# Altium integrated library Altium_PCB_Connector.IntLib: 293 symbols (part 2 of 3) (continued)
## 653115131822 (continued)
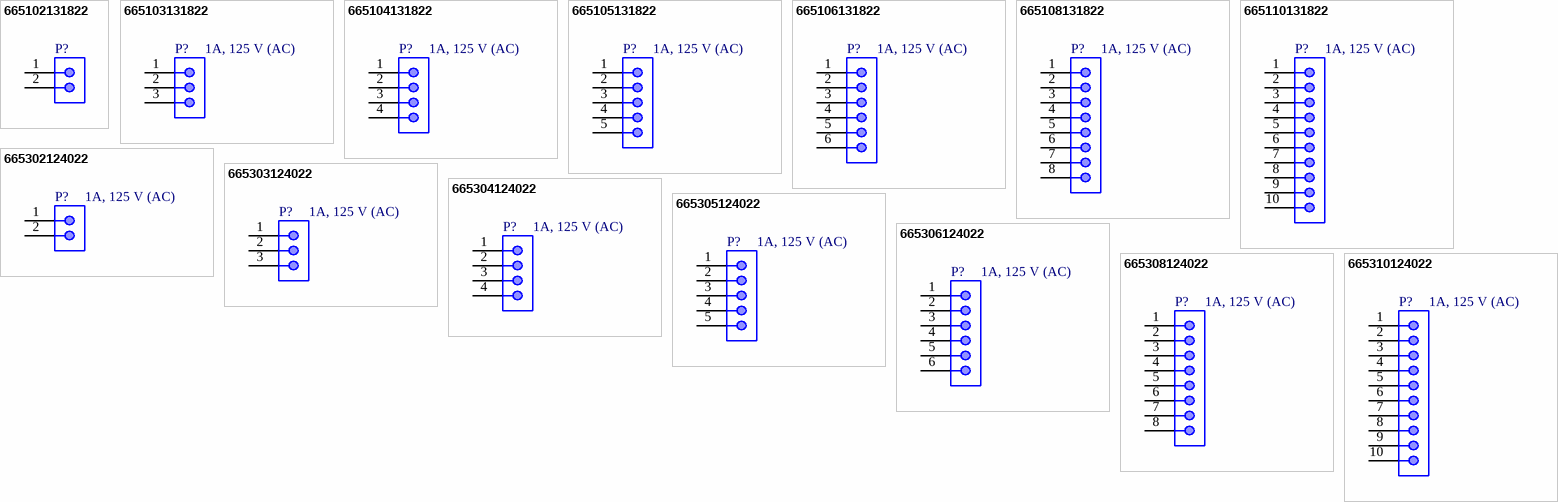
[diagram p9: symbols 665102131822 to 665310124022]

## 665102131822
designator P?, comment 1A, 125 V (AC)  (value not drawn)
WR-WTB SMT Male Horizontal Shrouded Header, pitch 1mm, 2p; Manufacturer: Wurth Elektronik; Manufacturer Part Number: 665102131822; Contact Resistance: 20mOhm; Withstanding Voltage: 500VAC; Working Voltage: 50VAC; Pin Number: 2; ComponentLink1Description: Datasheet; ComponentLink1URL: https://www.we-online.com/catalog/datasheet/665102131822.pdf; Pitch: 1mm; Packaging: Tape and Reel; Gender: Male; Type: Horizontal; Rated Current: 1A; Supplier 1 URL: https://www.mouser.vn/ProductDetail/Wurth-Elektronik/665102131822?qs=a9WhcLg8qCyfz%252BqUVI6DEA%3D%3D; Supplier 2 URL: N/A; Supplier 3 URL: N/A; Value: 1A, 125 V (AC); LCSC Part #: N/A; Mount: SMD/SMT; Operating Temperature Max: + 85 C; Operating Temperature Min: - 25 C; Package / Case: 2; Supplier 1: Mouser; Supplier 1 Part Number: 710-665102131822; Supplier 2: Digi-Key; Supplier 2 Part Number: N/A; Supplier 3: thegioiic; Supplier 3 Part Number: N/A
footprint 665102131822
pins: 1, 2

## 665103131822
designator P?, comment 1A, 125 V (AC)
WR-WTB SMT Male Horizontal Shrouded Header, pitch 1mm, 3p; Manufacturer: Wurth Elektronik; Manufacturer Part Number: 665103131822; Pin Number: 3; Contact Resistance: 20mOhm; Withstanding Voltage: 500VAC; Working Voltage: 50VAC; ComponentLink1Description: Datasheet; ComponentLink1URL: https://www.we-online.com/catalog/datasheet/665103131822.pdf; Pitch: 1mm; Packaging: Tape and Reel; Gender: Male; Type: Horizontal; Rated Current: 1A; Supplier 1 URL: https://www.mouser.vn/ProductDetail/Wurth-Elektronik/665103131822?qs=a9WhcLg8qCxyoubUoVempg%3D%3D; Supplier 2 URL: N/A; Supplier 3 URL: N/A; Value: 1A, 125 V (AC); LCSC Part #: N/A; Mount: SMD/SMT; Operating Temperature Max: + 85 C; Operating Temperature Min: - 25 C; Package / Case: 3; Supplier 1: Mouser; Supplier 1 Part Number: 710-665103131822; Supplier 2: Digi-Key; Supplier 2 Part Number: N/A; Supplier 3: thegioiic; Supplier 3 Part Number: N/A
footprint 665103131822
pins: 1, 2, 3

## 665104131822
designator P?, comment 1A, 125 V (AC)
WR-WTB SMT Male Horizontal Shrouded Header, pitch 1mm, 4p; Manufacturer: Wurth Elektronik; Manufacturer Part Number: 665104131822; Pin Number: 4; Contact Resistance: 20mOhm; Withstanding Voltage: 500VAC; Working Voltage: 50VAC; ComponentLink1Description: Datasheet; ComponentLink1URL: https://www.we-online.com/catalog/datasheet/665104131822.pdf; Pitch: 1mm; Packaging: Tape and Reel; Gender: Male; Type: Horizontal; Rated Current: 1A; Supplier 1 URL: https://www.mouser.vn/ProductDetail/Wurth-Elektronik/665104131822?qs=a9WhcLg8qCxe2o4Xu%2FqBdg%3D%3D; Supplier 2 URL: N/A; Supplier 3 URL: N/A; Value: 1A, 125 V (AC); LCSC Part #: N/A; Mount: SMD/SMT; Operating Temperature Max: + 85 C; Operating Temperature Min: - 25 C; Package / Case: 4; Supplier 1: Mouser; Supplier 1 Part Number: 710-665104131822; Supplier 2: Digi-Key; Supplier 2 Part Number: N/A; Supplier 3: thegioiic; Supplier 3 Part Number: N/A
footprint 665104131822
pins: 1, 2, 3, 4

## 665105131822
designator P?, comment 1A, 125 V (AC)
WR-WTB SMT Male Horizontal Shrouded Header, pitch 1mm, 5p; Manufacturer: Wurth Elektronik; Manufacturer Part Number: 665105131822; Pin Number: 5; Contact Resistance: 20mOhm; Withstanding Voltage: 500VAC; Working Voltage: 50VAC; ComponentLink1Description: Datasheet; ComponentLink1URL: https://www.we-online.com/catalog/datasheet/665105131822.pdf; Pitch: 1mm; Packaging: Tape and Reel; Gender: Male; Type: Horizontal; Rated Current: 1A; Supplier 1 URL: https://www.mouser.vn/ProductDetail/Wurth-Elektronik/665105131822?qs=a9WhcLg8qCxS6l8cra2J9Q%3D%3D; Supplier 2 URL: N/A; Supplier 3 URL: N/A; Value: 1A, 125 V (AC); LCSC Part #: N/A; Mount: SMD/SMT; Operating Temperature Max: + 85 C; Operating Temperature Min: - 25 C; Package / Case: 5; Supplier 1: Mouser; Supplier 1 Part Number: 710-665105131822; Supplier 2: Digi-Key; Supplier 2 Part Number: N/A; Supplier 3: thegioiic; Supplier 3 Part Number: N/A
footprint 665105131822
pins: 1, 2, 3, 4, 5

## 665106131822
designator P?, comment 1A, 125 V (AC)
WR-WTB SMT Male Horizontal Shrouded Header, pitch 1mm, 6p; Manufacturer: Wurth Elektronik; Manufacturer Part Number: 665106131822; Pin Number: 6; Contact Resistance: 20mOhm; Withstanding Voltage: 500VAC; Working Voltage: 50VAC; ComponentLink1Description: Datasheet; ComponentLink1URL: https://www.we-online.com/catalog/datasheet/665106131822.pdf; Pitch: 1mm; Packaging: Tape and Reel; Gender: Male; Type: Horizontal; Rated Current: 1A; Supplier 1 URL: https://www.mouser.vn/ProductDetail/Wurth-Elektronik/665106131822?qs=a9WhcLg8qCzjoKPkPpCp%2FA%3D%3D; Supplier 2 URL: N/A; Supplier 3 URL: N/A; Value: 1A, 125 V (AC); LCSC Part #: N/A; Mount: SMD/SMT; Operating Temperature Max: + 85 C; Operating Temperature Min: - 25 C; Package / Case: 6; Supplier 1: Mouser; Supplier 1 Part Number: 710-665106131822; Supplier 2: Digi-Key; Supplier 2 Part Number: N/A; Supplier 3: thegioiic; Supplier 3 Part Number: N/A
footprint 665106131822
pins: 1, 2, 3, 4, 5, 6

## 665108131822
designator P?, comment 1A, 125 V (AC)
WR-WTB SMT Male Horizontal Shrouded Header, pitch 1mm, 8p; Manufacturer: Wurth Elektronik; Manufacturer Part Number: 665108131822; Pin Number: 8; Contact Resistance: 20mOhm; Withstanding Voltage: 500VAC; Working Voltage: 50VAC; ComponentLink1Description: Datasheet; ComponentLink1URL: https://www.we-online.com/catalog/datasheet/665108131822.pdf; Pitch: 1mm; Packaging: Tape and Reel; Gender: Male; Type: Horizontal; Rated Current: 1A; Supplier 1 URL: https://www.mouser.vn/ProductDetail/Wurth-Elektronik/665108131822?qs=a9WhcLg8qCyjJKQ1fQ4DGg%3D%3D; Supplier 2 URL: N/A; Supplier 3 URL: N/A; Value: 1A, 125 V (AC); LCSC Part #: N/A; Mount: SMD/SMT; Operating Temperature Max: + 85 C; Operating Temperature Min: - 25 C; Package / Case: 8; Supplier 1: Mouser; Supplier 1 Part Number: 710-665108131822; Supplier 2: Digi-Key; Supplier 2 Part Number: N/A; Supplier 3: thegioiic; Supplier 3 Part Number: N/A
footprint 665108131822
pins: 1, 2, 3, 4, 5, 6, 7, 8

## 665110131822
designator P?, comment 1A, 125 V (AC)
WR-WTB SMT Male Horizontal Shrouded Header, pitch 1mm, 10p; Manufacturer: Wurth Elektronik; Manufacturer Part Number: 665110131822; Pin Number: 10; Contact Resistance: 20mOhm; Withstanding Voltage: 500VAC; Working Voltage: 50VAC; ComponentLink1Description: Datasheet; ComponentLink1URL: https://www.we-online.com/catalog/datasheet/665110131822.pdf; Pitch: 1mm; Packaging: Tape and Reel; Gender: Male; Type: Horizontal; Rated Current: 1A; Supplier 1 URL: https://www.mouser.vn/ProductDetail/Wurth-Elektronik/665110131822?qs=a9WhcLg8qCwEjDOe0bibPQ%3D%3D; Supplier 2 URL: N/A; Supplier 3 URL: N/A; Value: 1A, 125 V (AC); LCSC Part #: N/A; Mount: SMD/SMT; Operating Temperature Max: + 85 C; Operating Temperature Min: - 25 C; Package / Case: 10; Supplier 1: Mouser; Supplier 1 Part Number: 710-665110131822; Supplier 2: Digi-Key; Supplier 2 Part Number: N/A; Supplier 3: thegioiic; Supplier 3 Part Number: N/A
footprint 665110131822
pins: 1, 2, 3, 4, 5, 6, 7, 8, 9, 10

## 665302124022
designator P?, comment 1A, 125 V (AC)
WR-WTB SMT Male Vertical Shrouded Header, pitch 1mm, 2p; Manufacturer: Wurth Elektronik; Manufacturer Part Number: 665302124022; Pin Number: 2; Contact Resistance: 20mOhm; Withstanding Voltage: 500VAC; Working Voltage: 50VAC; ComponentLink1Description: Datasheet; ComponentLink1URL: https://www.we-online.com/catalog/datasheet/665302124022.pdf; Pitch: 1mm; Packaging: Tape and Reel; Gender: Male; Type: Vertical; Rated Current: 1A; Supplier 1 URL: https://www.mouser.vn/ProductDetail/Wurth-Elektronik/665302124022?qs=a9WhcLg8qCx0IT99cXBqTA%3D%3D; Supplier 2 URL: N/A; Supplier 3 URL: N/A; Value: 1A, 125 V (AC); LCSC Part #: N/A; Mount: SMD/SMT; Operating Temperature Max: + 85 C; Operating Temperature Min: - 25 C; Package / Case: 2; Supplier 1: Mouser; Supplier 1 Part Number: 710-665302124022; Supplier 2: Digi-Key; Supplier 2 Part Number: N/A; Supplier 3: thegioiic; Supplier 3 Part Number: N/A
footprint 665302124022
pins: 1, 2

## 665303124022
designator P?, comment 1A, 125 V (AC)
WR-WTB SMT Male Vertical Shrouded Header, pitch 1mm, 3p; Manufacturer: Wurth Elektronik; Manufacturer Part Number: 665303124022; Pin Number: 3; Contact Resistance: 20mOhm; Withstanding Voltage: 500VAC; Working Voltage: 50VAC; ComponentLink1Description: Datasheet; ComponentLink1URL: https://www.we-online.com/catalog/datasheet/665303124022.pdf; Pitch: 1mm; Packaging: Tape and Reel; Gender: Male; Type: Vertical; Rated Current: 1A; Supplier 1 URL: https://www.mouser.vn/ProductDetail/Wurth-Elektronik/665303124022?qs=a9WhcLg8qCyV5ri9HU4hCQ%3D%3D; Supplier 2 URL: N/A; Supplier 3 URL: N/A; Value: 1A, 125 V (AC); LCSC Part #: N/A; Mount: SMD/SMT; Operating Temperature Max: + 85 C; Operating Temperature Min: - 25 C; Package / Case: 3; Supplier 1: Mouser; Supplier 1 Part Number: 710-665303124022; Supplier 2: Digi-Key; Supplier 2 Part Number: N/A; Supplier 3: thegioiic; Supplier 3 Part Number: N/A
footprint 665303124022
pins: 1, 2, 3

## 665304124022
designator P?, comment 1A, 125 V (AC)
WR-WTB SMT Male Vertical Shrouded Header, pitch 1mm, 4p; Manufacturer: Wurth Elektronik; Manufacturer Part Number: 665304124022; Pin Number: 4; Contact Resistance: 20mOhm; Withstanding Voltage: 500VAC; Working Voltage: 50VAC; ComponentLink1Description: Datasheet; ComponentLink1URL: https://www.we-online.com/catalog/datasheet/665304124022.pdf; Pitch: 1mm; Packaging: Tape and Reel; Gender: Male; Type: Vertical; Rated Current: 1A; Supplier 1 URL: https://www.mouser.vn/ProductDetail/Wurth-Elektronik/665304124022?qs=a9WhcLg8qCx8aEna1KcTfg%3D%3D; Supplier 2 URL: N/A; Supplier 3 URL: N/A; Value: 1A, 125 V (AC); LCSC Part #: N/A; Mount: SMD/SMT; Operating Temperature Max: + 85 C; Operating Temperature Min: - 25 C; Package / Case: 4; Supplier 1: Mouser; Supplier 1 Part Number: 710-665304124022; Supplier 2: Digi-Key; Supplier 2 Part Number: N/A; Supplier 3: thegioiic; Supplier 3 Part Number: N/A
footprint 665304124022
pins: 1, 2, 3, 4

## 665305124022
designator P?, comment 1A, 125 V (AC)
WR-WTB SMT Male Vertical Shrouded Header, pitch 1mm, 5p; Manufacturer: Wurth Elektronik; Manufacturer Part Number: 665305124022; Pin Number: 5; Contact Resistance: 20mOhm; Withstanding Voltage: 500VAC; Working Voltage: 50VAC; ComponentLink1Description: Datasheet; ComponentLink1URL: https://www.we-online.com/catalog/datasheet/665305124022.pdf; Pitch: 1mm; Packaging: Tape and Reel; Gender: Male; Type: Vertical; Rated Current: 1A; Supplier 1 URL: https://www.mouser.vn/ProductDetail/Wurth-Elektronik/665305124022?qs=a9WhcLg8qCwo9s3v61a5IA%3D%3D; Supplier 2 URL: N/A; Supplier 3 URL: N/A; Value: 1A, 125 V (AC); LCSC Part #: N/A; Mount: SMD/SMT; Operating Temperature Max: + 85 C; Operating Temperature Min: - 25 C; Package / Case: 5; Supplier 1: Mouser; Supplier 1 Part Number: 710-665305124022; Supplier 2: Digi-Key; Supplier 2 Part Number: N/A; Supplier 3: thegioiic; Supplier 3 Part Number: N/A
footprint 665305124022
pins: 1, 2, 3, 4, 5

## 665306124022
designator P?, comment 1A, 125 V (AC)
WR-WTB SMT Male Vertical Shrouded Header, pitch 1mm, 6p; Manufacturer: Wurth Elektronik; Manufacturer Part Number: 665306124022; Pin Number: 6; Contact Resistance: 20mOhm; Withstanding Voltage: 500VAC; Working Voltage: 50VAC; ComponentLink1Description: Datasheet; ComponentLink1URL: https://www.we-online.com/catalog/datasheet/665306124022.pdf; Pitch: 1mm; Packaging: Tape and Reel; Gender: Male; Type: Vertical; Rated Current: 1A; Supplier 1 URL: https://www.mouser.vn/ProductDetail/Wurth-Elektronik/665306124022?qs=a9WhcLg8qCxSEVNGK%2FCChQ%3D%3D; Supplier 2 URL: N/A; Supplier 3 URL: N/A; Value: 1A, 125 V (AC); LCSC Part #: N/A; Mount: SMD/SMT; Operating Temperature Max: + 85 C; Operating Temperature Min: - 25 C; Package / Case: 6; Supplier 1: Mouser; Supplier 1 Part Number: 710-665306124022; Supplier 2: Digi-Key; Supplier 2 Part Number: N/A; Supplier 3: thegioiic; Supplier 3 Part Number: N/A
footprint 665306124022
pins: 1, 2, 3, 4, 5, 6

## 665308124022
designator P?, comment 1A, 125 V (AC)
WR-WTB SMT Male Vertical Shrouded Header, pitch 1mm, 8p; Manufacturer: Wurth Elektronik; Manufacturer Part Number: 665308124022; Pin Number: 8; Contact Resistance: 20mOhm; Withstanding Voltage: 500VAC; Working Voltage: 50VAC; ComponentLink1Description: Datasheet; ComponentLink1URL: https://www.we-online.com/catalog/datasheet/665308124022.pdf; Pitch: 1mm; Packaging: Tape and Reel; Gender: Male; Type: Vertical; Rated Current: 1A; Supplier 1 URL: https://www.mouser.vn/ProductDetail/Wurth-Elektronik/665308124022?qs=a9WhcLg8qCyktw513mQiKg%3D%3D; Supplier 2 URL: N/A; Supplier 3 URL: N/A; Value: 1A, 125 V (AC); LCSC Part #: N/A; Mount: SMD/SMT; Operating Temperature Max: + 85 C; Operating Temperature Min: - 25 C; Package / Case: 8; Supplier 1: Mouser; Supplier 1 Part Number: 710-665308124022; Supplier 2: Digi-Key; Supplier 2 Part Number: N/A; Supplier 3: thegioiic; Supplier 3 Part Number: N/A
footprint 665308124022
pins: 1, 2, 3, 4, 5, 6, 7, 8

## 665310124022
designator P?, comment 1A, 125 V (AC)
WR-WTB SMT Male Vertical Shrouded Header, pitch 1mm, 10p; Manufacturer: Wurth Elektronik; Manufacturer Part Number: 665310124022; Pin Number: 10; Contact Resistance: 20mOhm; Withstanding Voltage: 500VAC; Working Voltage: 50VAC; ComponentLink1Description: Datasheet; ComponentLink1URL: https://www.we-online.com/catalog/datasheet/665310124022.pdf; Pitch: 1mm; Packaging: Tape and Reel; Gender: Male; Type: Vertical; Rated Current: 1A; Supplier 1 URL: https://www.mouser.vn/ProductDetail/Wurth-Elektronik/665310124022?qs=a9WhcLg8qCwxv%252BltsO6F6Q%3D%3D; Supplier 2 URL: N/A; Supplier 3 URL: N/A; Value: 1A, 125 V (AC); LCSC Part #: N/A; Mount: SMD/SMT; Operating Temperature Max: + 85 C; Operating Temperature Min: - 25 C; Package / Case: 10; Supplier 1: Mouser; Supplier 1 Part Number: 710-665310124022; Supplier 2: Digi-Key; Supplier 2 Part Number: N/A; Supplier 3: thegioiic; Supplier 3 Part Number: N/A
footprint 665310124022
pins: 1, 2, 3, 4, 5, 6, 7, 8, 9, 10


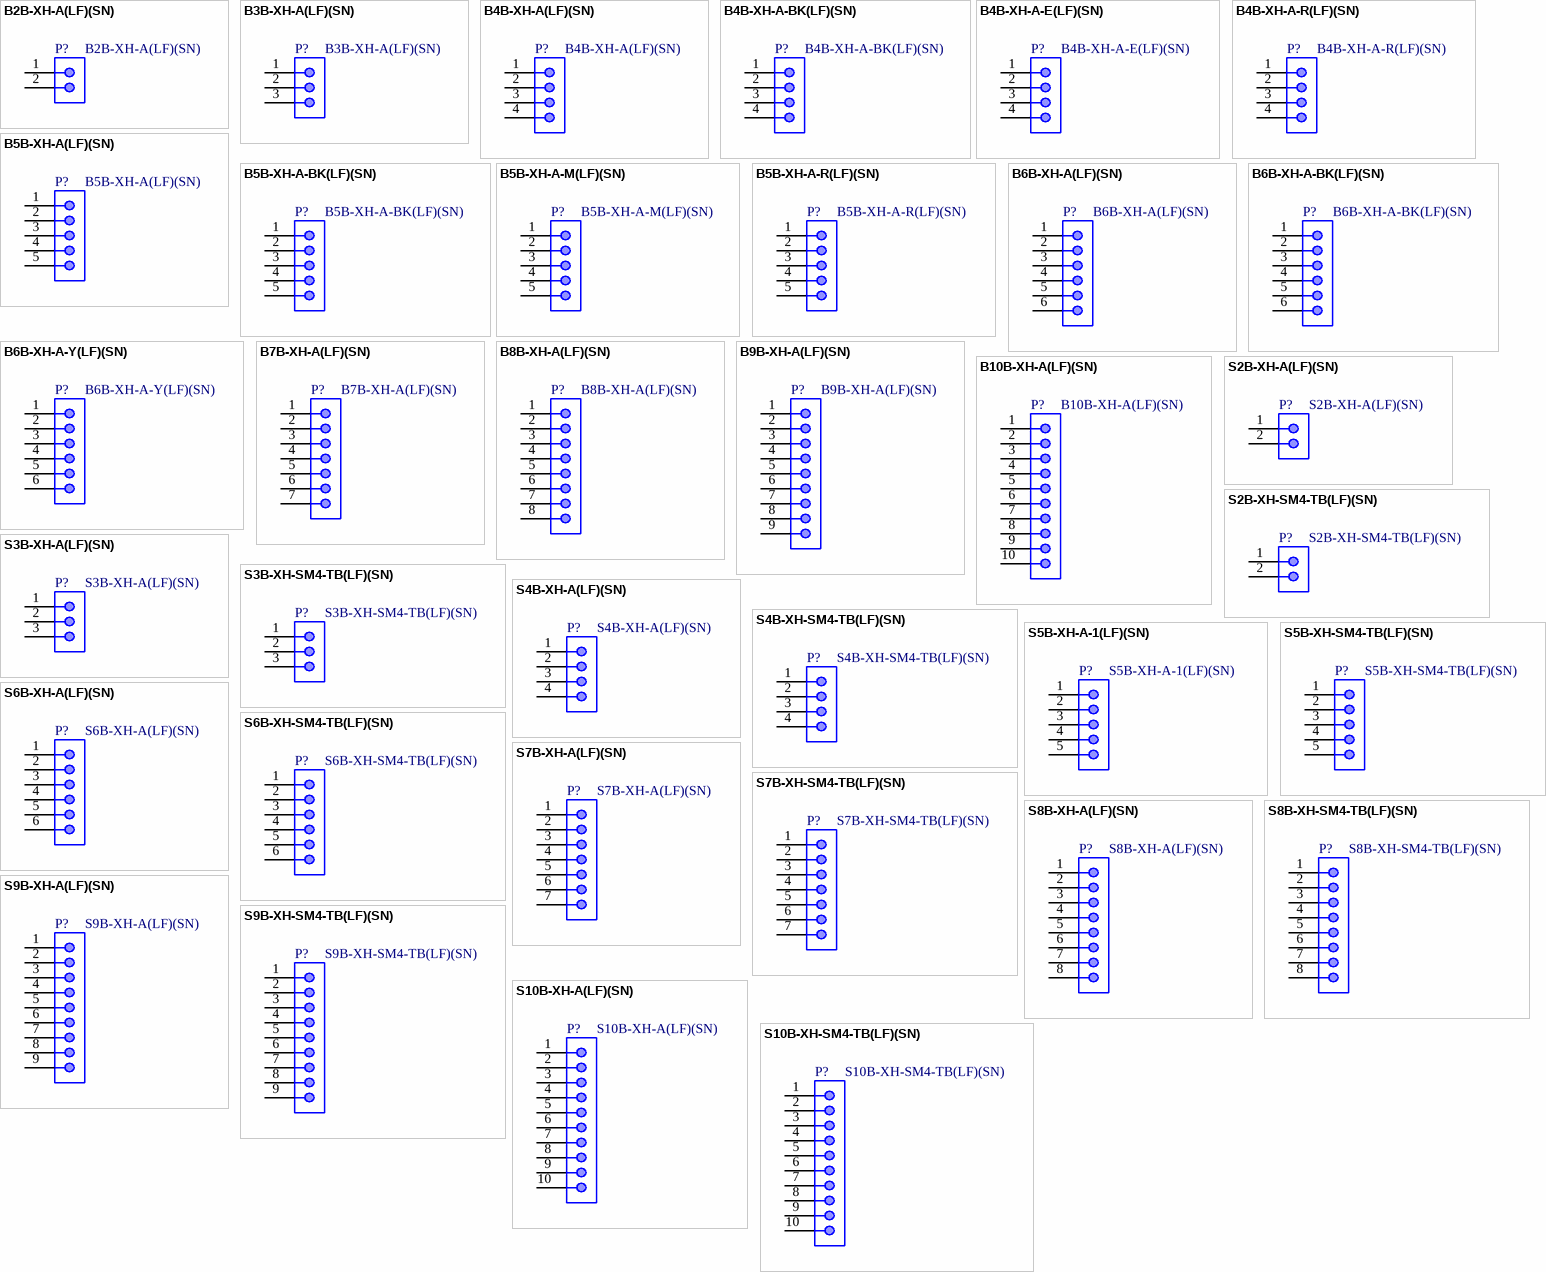
[diagram p10: symbols B2B-XH-A(LF)(SN) to S10B-XH-SM4-TB(LF)(SN)]

## B2B-XH-A(LF)(SN)
designator P?
1x2P 2P XH 1 Tin 2.5mm 2 -25℃~+85℃ 3A Brass Straight Plugin,P=2.5mm Wire To Board / Wire To Wire Connector ROHS; Manufacturer: JST; Pin Number: 2; Contact Resistance: 20mOhm; Gender: Male; Withstanding Voltage: 1000VAC; Working Voltage: 250VAC; ComponentLink1Description: Datasheet; ComponentLink1URL: https://www.lcsc.com/datasheet/lcsc_datasheet_2304140030_JST-B2B-XH-A-LF-SN_C158012.pdf; Pitch: 2.5mm; Packaging: Bag; Type: Vertical; Rated Current: 3A; Supplier 1 URL: N/A; Supplier 2 URL: N/A; Supplier 3 URL: https://www.thegioiic.com/dau-xh-2-54mm-2-chan-thang-xuyen-lo; Value: B2B-XH-A(LF)(SN); LCSC Part #: C158012; Manufacturer Part Number: B2B-XH-A(LF)(SN); Mount: THT; Operating Temperature Max: + 85 C; Operating Temperature Min: - 20 C; Package / Case: 2; Supplier 1: Mouser; Supplier 1 Part Number: N/A; Supplier 2: Digi-Key; Supplier 2 Part Number: N/A; Supplier 3: thegioiic; Supplier 3 Part Number: N/A
footprint 619000211121 (2.54mm Male Locking Header, 2p)
pins: 1, 2

## B3B-XH-A(LF)(SN)
designator P?
1x3P 3P XH 1 Tin 2.5mm 3 -25℃~+85℃ 3A Brass Straight Plugin,P=2.5mm Wire To Board / Wire To Wire Connector ROHS; Manufacturer: JST; Pin Number: 3; Contact Resistance: 20mOhm; Gender: Male; Withstanding Voltage: 1000VAC; Working Voltage: 250VAC; ComponentLink1Description: Datasheet; ComponentLink1URL: https://www.lcsc.com/datasheet/lcsc_datasheet_2304140030_JST-B2B-XH-A-LF-SN_C158012.pdf; Pitch: 2.5mm; Packaging: Bag; Type: Vertical; Rated Current: 3A; Supplier 1 URL: N/A; Supplier 2 URL: N/A; Supplier 3 URL: https://www.thegioiic.com/dau-xh-2-54mm-3-chan-thang-xuyen-lo; Value: B3B-XH-A(LF)(SN); LCSC Part #: C144394; Manufacturer Part Number: B3B-XH-A(LF)(SN); Mount: THT; Operating Temperature Max: + 85 C; Operating Temperature Min: - 20 C; Package / Case: 3; Supplier 1: Mouser; Supplier 1 Part Number: N/A; Supplier 2: Digi-Key; Supplier 2 Part Number: N/A; Supplier 3: thegioiic; Supplier 3 Part Number: N/A
footprint 619000311121 (2.54mm Male Locking Header, 3p)
pins: 1, 2, 3

## B4B-XH-A(LF)(SN)
designator P?
1x4P 4P XH 1 Tin 2.5mm 4 -25℃~+85℃ 3A Brass Straight Plugin,P=2.5mm Wire To Board / Wire To Wire Connector ROHS; Manufacturer: JST; Pin Number: 4; Contact Resistance: 20mOhm; Gender: Male; Withstanding Voltage: 1000VAC; Working Voltage: 250VAC; ComponentLink1Description: Datasheet; ComponentLink1URL: https://www.lcsc.com/datasheet/lcsc_datasheet_2304140030_JST-B2B-XH-A-LF-SN_C158012.pdf; Pitch: 2.5mm; Packaging: Bag; Type: Vertical; Rated Current: 3A; Supplier 1 URL: N/A; Supplier 2 URL: N/A; Supplier 3 URL: https://www.thegioiic.com/dau-xh-2-54mm-4-chan-thang-xuyen-lo; Value: B4B-XH-A(LF)(SN); LCSC Part #: C144395; Manufacturer Part Number: B4B-XH-A(LF)(SN); Mount: THT; Operating Temperature Max: + 85 C; Operating Temperature Min: - 20 C; Package / Case: 4; Supplier 1: Mouser; Supplier 1 Part Number: N/A; Supplier 2: Digi-Key; Supplier 2 Part Number: N/A; Supplier 3: thegioiic; Supplier 3 Part Number: N/A
footprint 619000411121 (2.54mm Male Locking Header, 4p)
pins: 1, 2, 3, 4

## B4B-XH-A-BK(LF)(SN)
designator P?
1x4P 4P XH 1 Tin 2.5mm 4 -25℃~+85℃ 3A Brass Straight Plugin,P=2.5mm Wire To Board / Wire To Wire Connector ROHS; Manufacturer: JST; Pin Number: 4; Contact Resistance: 20mOhm; Gender: Male; Withstanding Voltage: 1000VAC; Working Voltage: 250VAC; ComponentLink1Description: Datasheet; ComponentLink1URL: https://www.lcsc.com/datasheet/lcsc_datasheet_2304140030_JST-B2B-XH-A-LF-SN_C158012.pdf; Pitch: 2.5mm; Packaging: Bag; Type: Vertical; Rated Current: 3A; Supplier 1 URL: N/A; Supplier 2 URL: N/A; Supplier 3 URL: https://www.thegioiic.com/dau-xh-2-54mm-4-chan-thang-xuyen-lo; Value: B4B-XH-A-BK(LF)(SN); LCSC Part #: C595709; Manufacturer Part Number: B4B-XH-A-BK(LF)(SN); Mount: THT; Operating Temperature Max: + 85 C; Operating Temperature Min: - 20 C; Package / Case: 4; Supplier 1: Mouser; Supplier 1 Part Number: N/A; Supplier 2: Digi-Key; Supplier 2 Part Number: N/A; Supplier 3: thegioiic; Supplier 3 Part Number: N/A
footprint 619000411121 (2.54mm Male Locking Header, 4p)
pins: 1, 2, 3, 4

## B4B-XH-A-E(LF)(SN)
designator P?
1x4P 4P XH 1 Tin 2.5mm 4 -25℃~+85℃ 3A Brass Straight Plugin,P=2.5mm Wire To Board / Wire To Wire Connector ROHS; Manufacturer: JST; Pin Number: 4; Contact Resistance: 20mOhm; Gender: Male; Withstanding Voltage: 1000VAC; Working Voltage: 250VAC; ComponentLink1Description: Datasheet; ComponentLink1URL: https://www.lcsc.com/datasheet/lcsc_datasheet_2304140030_JST-B2B-XH-A-LF-SN_C158012.pdf; Pitch: 2.5mm; Packaging: Bag; Type: Vertical; Rated Current: 3A; Supplier 1 URL: N/A; Supplier 2 URL: N/A; Supplier 3 URL: https://www.thegioiic.com/dau-xh-2-54mm-4-chan-thang-xuyen-lo; Value: B4B-XH-A-E(LF)(SN); LCSC Part #: C566014; Manufacturer Part Number: B4B-XH-A-E(LF)(SN); Mount: THT; Operating Temperature Max: + 85 C; Operating Temperature Min: - 20 C; Package / Case: 4; Supplier 1: Mouser; Supplier 1 Part Number: N/A; Supplier 2: Digi-Key; Supplier 2 Part Number: N/A; Supplier 3: thegioiic; Supplier 3 Part Number: N/A
footprint 619000411121 (2.54mm Male Locking Header, 4p)
pins: 1, 2, 3, 4

## B4B-XH-A-R(LF)(SN)
designator P?
1x4P 4P XH 1 Tin 2.5mm 4 -25℃~+85℃ 3A Brass Straight Plugin,P=2.5mm Wire To Board / Wire To Wire Connector ROHS; Manufacturer: JST; Pin Number: 4; Contact Resistance: 20mOhm; Gender: Male; Withstanding Voltage: 1000VAC; Working Voltage: 250VAC; ComponentLink1Description: Datasheet; ComponentLink1URL: https://www.lcsc.com/datasheet/lcsc_datasheet_2304140030_JST-B2B-XH-A-LF-SN_C158012.pdf; Pitch: 2.5mm; Packaging: Bag; Type: Vertical; Rated Current: 3A; Supplier 1 URL: N/A; Supplier 2 URL: N/A; Supplier 3 URL: https://www.thegioiic.com/dau-xh-2-54mm-4-chan-thang-xuyen-lo; Value: B4B-XH-A-R(LF)(SN); LCSC Part #: C595709; Manufacturer Part Number: B4B-XH-A-R(LF)(SN); Mount: THT; Operating Temperature Max: + 85 C; Operating Temperature Min: - 20 C; Package / Case: 4; Supplier 1: Mouser; Supplier 1 Part Number: N/A; Supplier 2: Digi-Key; Supplier 2 Part Number: N/A; Supplier 3: thegioiic; Supplier 3 Part Number: N/A
footprint 619000411121 (2.54mm Male Locking Header, 4p)
pins: 1, 2, 3, 4

## B5B-XH-A(LF)(SN)
designator P?
1x5P 5P XH 1 Tin 2.5mm 5 -25℃~+85℃ 3A Brass Straight Plugin,P=2.5mm Wire To Board / Wire To Wire Connector ROHS; Manufacturer: JST; Pin Number: 5; Contact Resistance: 20mOhm; Gender: Male; Withstanding Voltage: 1000VAC; Working Voltage: 250VAC; ComponentLink1Description: Datasheet; ComponentLink1URL: https://www.lcsc.com/datasheet/lcsc_datasheet_2304140030_JST-B2B-XH-A-LF-SN_C158012.pdf; Pitch: 2.5mm; Packaging: Bag; Type: Vertical; Rated Current: 3A; Supplier 1 URL: N/A; Supplier 2 URL: N/A; Supplier 3 URL: https://www.thegioiic.com/dau-xh-2-54mm-5-chan-thang-xuyen-lo; Value: B5B-XH-A(LF)(SN); LCSC Part #: C157991; Manufacturer Part Number: B5B-XH-A(LF)(SN); Mount: THT; Operating Temperature Max: + 85 C; Operating Temperature Min: - 20 C; Package / Case: 5; Supplier 1: Mouser; Supplier 1 Part Number: N/A; Supplier 2: Digi-Key; Supplier 2 Part Number: N/A; Supplier 3: thegioiic; Supplier 3 Part Number: N/A
footprint 619000511121 (2.54mm Male Locking Header, 5p)
pins: 1, 2, 3, 4, 5

## B5B-XH-A-BK(LF)(SN)
designator P?
1x5P 5P XH 1 Tin 2.5mm 5 -25℃~+85℃ 3A Brass Straight Plugin,P=2.5mm Wire To Board / Wire To Wire Connector ROHS; Manufacturer: JST; Pin Number: 5; Contact Resistance: 20mOhm; Gender: Male; Withstanding Voltage: 1000VAC; Working Voltage: 250VAC; ComponentLink1Description: Datasheet; ComponentLink1URL: https://www.lcsc.com/datasheet/lcsc_datasheet_2304140030_JST-B2B-XH-A-LF-SN_C158012.pdf; Pitch: 2.5mm; Packaging: Bag; Type: Vertical; Rated Current: 3A; Supplier 1 URL: N/A; Supplier 2 URL: N/A; Supplier 3 URL: https://www.thegioiic.com/dau-xh-2-54mm-5-chan-thang-xuyen-lo; Value: B5B-XH-A-BK(LF)(SN); LCSC Part #: C378947; Manufacturer Part Number: B5B-XH-A-BK(LF)(SN); Mount: THT; Operating Temperature Max: + 85 C; Operating Temperature Min: - 20 C; Package / Case: 5; Supplier 1: Mouser; Supplier 1 Part Number: N/A; Supplier 2: Digi-Key; Supplier 2 Part Number: N/A; Supplier 3: thegioiic; Supplier 3 Part Number: N/A
footprint 619000511121 (2.54mm Male Locking Header, 5p)
pins: 1, 2, 3, 4, 5

## B5B-XH-A-M(LF)(SN)
designator P?
1x5P 5P XH 1 Tin 2.5mm 5 -25℃~+85℃ 3A Brass Straight Plugin,P=2.5mm Wire To Board / Wire To Wire Connector ROHS; Manufacturer: JST; Pin Number: 5; Contact Resistance: 20mOhm; Gender: Male; Withstanding Voltage: 1000VAC; Working Voltage: 250VAC; ComponentLink1Description: Datasheet; ComponentLink1URL: https://www.lcsc.com/datasheet/lcsc_datasheet_2304140030_JST-B2B-XH-A-LF-SN_C158012.pdf; Pitch: 2.5mm; Packaging: Bag; Type: Vertical; Rated Current: 3A; Supplier 1 URL: N/A; Supplier 2 URL: N/A; Supplier 3 URL: https://www.thegioiic.com/dau-xh-2-54mm-5-chan-thang-xuyen-lo; Value: B5B-XH-A-M(LF)(SN); LCSC Part #: C495550; Manufacturer Part Number: B5B-XH-A-M(LF)(SN); Mount: THT; Operating Temperature Max: + 85 C; Operating Temperature Min: - 20 C; Package / Case: 5; Supplier 1: Mouser; Supplier 1 Part Number: N/A; Supplier 2: Digi-Key; Supplier 2 Part Number: N/A; Supplier 3: thegioiic; Supplier 3 Part Number: N/A
footprint 619000511121 (2.54mm Male Locking Header, 5p)
pins: 1, 2, 3, 4, 5

## B5B-XH-A-R(LF)(SN)
designator P?
1x5P 5P XH 1 Tin 2.5mm 5 -25℃~+85℃ 3A Brass Straight Plugin,P=2.5mm Wire To Board / Wire To Wire Connector ROHS; Manufacturer: JST; Pin Number: 5; Contact Resistance: 20mOhm; Gender: Male; Withstanding Voltage: 1000VAC; Working Voltage: 250VAC; ComponentLink1Description: Datasheet; ComponentLink1URL: https://www.lcsc.com/datasheet/lcsc_datasheet_2304140030_JST-B2B-XH-A-LF-SN_C158012.pdf; Pitch: 2.5mm; Packaging: Bag; Type: Vertical; Rated Current: 3A; Supplier 1 URL: N/A; Supplier 2 URL: N/A; Supplier 3 URL: https://www.thegioiic.com/dau-xh-2-54mm-5-chan-thang-xuyen-lo; Value: B5B-XH-A-R(LF)(SN); LCSC Part #: C38570328; Manufacturer Part Number: B5B-XH-A-R(LF)(SN); Mount: THT; Operating Temperature Max: + 85 C; Operating Temperature Min: - 20 C; Package / Case: 5; Supplier 1: Mouser; Supplier 1 Part Number: N/A; Supplier 2: Digi-Key; Supplier 2 Part Number: N/A; Supplier 3: thegioiic; Supplier 3 Part Number: N/A
footprint 619000511121 (2.54mm Male Locking Header, 5p)
pins: 1, 2, 3, 4, 5

## B6B-XH-A(LF)(SN)
designator P?
1x6P 6P XH 1 Tin 2.5mm 6 -25℃~+85℃ 3A Brass Straight Plugin,P=2.5mm Wire To Board / Wire To Wire Connector ROHS; Manufacturer: JST; Pin Number: 6; Contact Resistance: 20mOhm; Gender: Male; Withstanding Voltage: 1000VAC; Working Voltage: 250VAC; ComponentLink1Description: Datasheet; ComponentLink1URL: https://www.lcsc.com/datasheet/lcsc_datasheet_2304140030_JST-B2B-XH-A-LF-SN_C158012.pdf; Pitch: 2.5mm; Packaging: Bag; Type: Vertical; Rated Current: 3A; Supplier 1 URL: N/A; Supplier 2 URL: N/A; Supplier 3 URL: https://www.thegioiic.com/dau-xh-2-54mm-6-chan-thang-xuyen-lo; Value: B6B-XH-A(LF)(SN); LCSC Part #: C144397; Manufacturer Part Number: B6B-XH-A(LF)(SN); Mount: THT; Operating Temperature Max: + 85 C; Operating Temperature Min: - 20 C; Package / Case: 6; Supplier 1: Mouser; Supplier 1 Part Number: N/A; Supplier 2: Digi-Key; Supplier 2 Part Number: N/A; Supplier 3: thegioiic; Supplier 3 Part Number: N/A
footprint 619000611121 (2.54mm Male Locking Header, 6p)
pins: 1, 2, 3, 4, 5, 6

## B6B-XH-A-BK(LF)(SN)
designator P?
1x6P 6P XH 1 Tin 2.5mm 6 -25℃~+85℃ 3A Brass Straight Plugin,P=2.5mm Wire To Board / Wire To Wire Connector ROHS; Manufacturer: JST; Pin Number: 6; Contact Resistance: 20mOhm; Gender: Male; Withstanding Voltage: 1000VAC; Working Voltage: 250VAC; ComponentLink1Description: Datasheet; ComponentLink1URL: https://www.lcsc.com/datasheet/lcsc_datasheet_2304140030_JST-B2B-XH-A-LF-SN_C158012.pdf; Pitch: 2.5mm; Packaging: Bag; Type: Vertical; Rated Current: 3A; Supplier 1 URL: N/A; Supplier 2 URL: N/A; Supplier 3 URL: https://www.thegioiic.com/dau-xh-2-54mm-6-chan-thang-xuyen-lo; Value: B6B-XH-A-BK(LF)(SN); LCSC Part #: C378950; Manufacturer Part Number: B6B-XH-A-BK(LF)(SN); Mount: THT; Operating Temperature Max: + 85 C; Operating Temperature Min: - 20 C; Package / Case: 6; Supplier 1: Mouser; Supplier 1 Part Number: N/A; Supplier 2: Digi-Key; Supplier 2 Part Number: N/A; Supplier 3: thegioiic; Supplier 3 Part Number: N/A
footprint 619000611121 (2.54mm Male Locking Header, 6p)
pins: 1, 2, 3, 4, 5, 6

## B6B-XH-A-Y(LF)(SN)
designator P?
1x6P 6P XH 1 Tin 2.5mm 6 -25℃~+85℃ 3A Brass Straight Plugin,P=2.5mm Wire To Board / Wire To Wire Connector ROHS; Manufacturer: JST; Pin Number: 6; Contact Resistance: 20mOhm; Gender: Male; Withstanding Voltage: 1000VAC; Working Voltage: 250VAC; ComponentLink1Description: Datasheet; ComponentLink1URL: https://www.lcsc.com/datasheet/lcsc_datasheet_2304140030_JST-B2B-XH-A-LF-SN_C158012.pdf; Pitch: 2.5mm; Packaging: Bag; Type: Vertical; Rated Current: 3A; Supplier 1 URL: N/A; Supplier 2 URL: N/A; Supplier 3 URL: https://www.thegioiic.com/dau-xh-2-54mm-6-chan-thang-xuyen-lo; Value: B6B-XH-A-Y(LF)(SN); LCSC Part #: C566057; Manufacturer Part Number: B6B-XH-A-Y(LF)(SN); Mount: THT; Operating Temperature Max: + 85 C; Operating Temperature Min: - 20 C; Package / Case: 6; Supplier 1: Mouser; Supplier 1 Part Number: N/A; Supplier 2: Digi-Key; Supplier 2 Part Number: N/A; Supplier 3: thegioiic; Supplier 3 Part Number: N/A
footprint 619000611121 (2.54mm Male Locking Header, 6p)
pins: 1, 2, 3, 4, 5, 6

## B7B-XH-A(LF)(SN)
designator P?
1x7P 7P XH 1 Tin 2.5mm 7 -25℃~+85℃ 3A Brass Straight Plugin,P=2.5mm Wire To Board / Wire To Wire Connector ROHS; Manufacturer: JST; Pin Number: 7; Contact Resistance: 20mOhm; Gender: Male; Withstanding Voltage: 1000VAC; Working Voltage: 250VAC; ComponentLink1Description: Datasheet; ComponentLink1URL: https://www.lcsc.com/datasheet/lcsc_datasheet_2304140030_JST-B2B-XH-A-LF-SN_C158012.pdf; Pitch: 2.5mm; Packaging: Bag; Type: Vertical; Rated Current: 3A; Supplier 1 URL: N/A; Supplier 2 URL: N/A; Supplier 3 URL: https://www.thegioiic.com/dau-xh-2-54mm-7-chan-thang-xuyen-lo; Value: B7B-XH-A(LF)(SN); LCSC Part #: C144398; Manufacturer Part Number: B7B-XH-A(LF)(SN); Mount: THT; Operating Temperature Max: + 85 C; Operating Temperature Min: - 20 C; Package / Case: 7; Supplier 1: Mouser; Supplier 1 Part Number: N/A; Supplier 2: Digi-Key; Supplier 2 Part Number: N/A; Supplier 3: thegioiic; Supplier 3 Part Number: N/A
footprint 619000711121 (2.54mm Male Locking Header, 7p)
pins: 1, 2, 3, 4, 5, 6, 7

## B8B-XH-A(LF)(SN)
designator P?
1x8P 8P XH 1 Tin 2.5mm 8 -25℃~+85℃ 3A Brass Straight Plugin,P=2.5mm Wire To Board / Wire To Wire Connector ROHS; Manufacturer: JST; Pin Number: 8; Contact Resistance: 20mOhm; Gender: Male; Withstanding Voltage: 1000VAC; Working Voltage: 250VAC; ComponentLink1Description: Datasheet; ComponentLink1URL: https://www.lcsc.com/datasheet/lcsc_datasheet_2304140030_JST-B2B-XH-A-LF-SN_C158012.pdf; Pitch: 2.5mm; Packaging: Bag; Type: Vertical; Rated Current: 3A; Supplier 1 URL: N/A; Supplier 2 URL: N/A; Supplier 3 URL: https://www.thegioiic.com/dau-xh-2-54mm-8-chan-thang-xuyen-lo; Value: B8B-XH-A(LF)(SN); LCSC Part #: C157972; Manufacturer Part Number: B8B-XH-A(LF)(SN); Mount: THT; Operating Temperature Max: + 85 C; Operating Temperature Min: - 20 C; Package / Case: 8; Supplier 1: Mouser; Supplier 1 Part Number: N/A; Supplier 2: Digi-Key; Supplier 2 Part Number: N/A; Supplier 3: thegioiic; Supplier 3 Part Number: N/A
footprint 619000811121 (2.54mm Male Locking Header, 8p)
pins: 1, 2, 3, 4, 5, 6, 7, 8

## B9B-XH-A(LF)(SN)
designator P?
1x9P 9P XH 1 Tin 2.5mm 9 -25℃~+85℃ Brass 3A Straight Plugin,P=2.5mm Wire To Board / Wire To Wire Connector ROHS; Manufacturer: JST; Pin Number: 9; Contact Resistance: 20mOhm; Gender: Male; Withstanding Voltage: 1000VAC; Working Voltage: 250VAC; ComponentLink1Description: Datasheet; ComponentLink1URL: https://www.lcsc.com/datasheet/lcsc_datasheet_2304140030_JST-B2B-XH-A-LF-SN_C158012.pdf; Pitch: 2.5mm; Packaging: Bag; Type: Vertical; Rated Current: 3A; Supplier 1 URL: N/A; Supplier 2 URL: N/A; Supplier 3 URL: https://www.thegioiic.com/dau-xh-2-54mm-9-chan-thang-xuyen-lo; Value: B9B-XH-A(LF)(SN); LCSC Part #: C157966; Manufacturer Part Number: B9B-XH-A(LF)(SN); Mount: THT; Operating Temperature Max: + 85 C; Operating Temperature Min: - 20 C; Package / Case: 9; Supplier 1: Mouser; Supplier 1 Part Number: N/A; Supplier 2: Digi-Key; Supplier 2 Part Number: N/A; Supplier 3: thegioiic; Supplier 3 Part Number: N/A
footprint 619000911121 (2.54mm Male Locking Header, 7p)
pins: 1, 2, 3, 4, 5, 6, 7, 8, 9

## B10B-XH-A(LF)(SN)
designator P?
1x10P 10P XH 1 Tin 2.5mm 10 -25℃~+85℃ Brass 3A Straight Plugin,P=2.5mm Wire To Board / Wire To Wire Connector ROHS; Manufacturer: JST; Pin Number: 10; Contact Resistance: 20mOhm; Gender: Male; Withstanding Voltage: 1000VAC; Working Voltage: 250VAC; ComponentLink1Description: Datasheet; ComponentLink1URL: https://www.lcsc.com/datasheet/lcsc_datasheet_2304140030_JST-B2B-XH-A-LF-SN_C158012.pdf; Pitch: 2.5mm; Packaging: Bag; Type: Vertical; Rated Current: 3A; Supplier 1 URL: N/A; Supplier 2 URL: N/A; Supplier 3 URL: https://www.thegioiic.com/dau-xh-2-54mm-10-chan-thang-xuyen-lo; Value: B10B-XH-A(LF)(SN); LCSC Part #: C565901; Manufacturer Part Number: B10B-XH-A(LF)(SN); Mount: THT; Operating Temperature Max: + 85 C; Operating Temperature Min: - 20 C; Package / Case: 10; Supplier 1: Mouser; Supplier 1 Part Number: N/A; Supplier 2: Digi-Key; Supplier 2 Part Number: N/A; Supplier 3: thegioiic; Supplier 3 Part Number: N/A
footprint 619001011121 (2.54mm Male Locking Header, 10p)
pins: 1, 2, 3, 4, 5, 6, 7, 8, 9, 10

## S2B-XH-A(LF)(SN)
designator P?
1x2P 2P XH 1 2.5mm 2 Brass Right-Angle Push-Pull,P=2.5mm Wire To Board / Wire To Wire Connector ROHS; Manufacturer: JST; Pin Number: 2; Contact Resistance: 20mOhm; Gender: Male; Rated Current: 3A; Withstanding Voltage: 1000VAC; Working Voltage: 250VAC; ComponentLink1Description: Datasheet; ComponentLink1URL: https://www.lcsc.com/datasheet/lcsc_datasheet_2304140030_JST-B2B-XH-A-LF-SN_C158012.pdf; Pitch: 2.5mm; Packaging: Bag; Type: Right Angled Bottom Locking; Supplier 1 URL: N/A; Supplier 2 URL: N/A; Supplier 3 URL: https://www.thegioiic.com/dau-xh-2-54mm-2-chan-cong-xuyen-lo; Value: S2B-XH-A(LF)(SN); LCSC Part #: C157931; Manufacturer Part Number: S2B-XH-A(LF)(SN); Mount: THT; Operating Temperature Max: + 85 C; Operating Temperature Min: - 20 C; Package / Case: 2; Supplier 1: Mouser; Supplier 1 Part Number: N/A; Supplier 2: Digi-Key; Supplier 2 Part Number: N/A; Supplier 3: thegioiic; Supplier 3 Part Number: N/A
footprint 619000211021 (2.54mm Male Left Angled Header Bottom Locking, 2p)
pins: 1, 2

## S2B-XH-SM4-TB(LF)(SN)
designator P?
1x2P 2P XH 1 2.5mm 2 Brass Right-Angle Push-Pull,P=2.5mm Wire To Board / Wire To Wire Connector ROHS; Manufacturer: JST; Pin Number: 2; Contact Resistance: 20mOhm; Gender: Male; Rated Current: 3A; Withstanding Voltage: 1000VAC; Working Voltage: 250VAC; ComponentLink1Description: Datasheet; ComponentLink1URL: https://www.lcsc.com/datasheet/lcsc_datasheet_2304140030_JST-B2B-XH-A-LF-SN_C158012.pdf; Pitch: 2.5mm; Packaging: Bag; Type: Right Angled Bottom Locking; Supplier 1 URL: N/A; Supplier 2 URL: N/A; Supplier 3 URL: https://www.thegioiic.com/dau-xh2-54mm-2-chan-dan-smd-nam-ngang; Value: S2B-XH-SM4-TB(LF)(SN); LCSC Part #: N/A; Manufacturer Part Number: S2B-XH-SM4-TB(LF)(SN); Mount: SMD; Operating Temperature Max: + 85 C; Operating Temperature Min: - 20 C; Package / Case: 2; Supplier 1: Mouser; Supplier 1 Part Number: N/A; Supplier 2: Digi-Key; Supplier 2 Part Number: N/A; Supplier 3: thegioiic; Supplier 3 Part Number: N/A
footprint 619000211221 (2.54mm Male Left Angled Header Bottom Locking, 2p)
pins: 1, 2

## S3B-XH-A(LF)(SN)
designator P?
1x3P 3P XH 1 2.5mm 3 Brass Right-Angle Push-Pull,P=2.5mm Wire To Board / Wire To Wire Connector ROHS; Manufacturer: JST; Pin Number: 3; Contact Resistance: 20mOhm; Gender: Male; Rated Current: 3A; Withstanding Voltage: 1000VAC; Working Voltage: 250VAC; ComponentLink1Description: Datasheet; ComponentLink1URL: https://www.lcsc.com/datasheet/lcsc_datasheet_2304140030_JST-B2B-XH-A-LF-SN_C158012.pdf; Pitch: 2.5mm; Packaging: Bag; Type: Right Angled Bottom Locking; Supplier 1 URL: N/A; Supplier 2 URL: N/A; Supplier 3 URL: https://www.thegioiic.com/dau-xh-2-54mm-3-chan-cong-xuyen-lo; Value: S3B-XH-A(LF)(SN); LCSC Part #: C157928; Manufacturer Part Number: S3B-XH-A(LF)(SN); Mount: THT; Operating Temperature Max: + 85 C; Operating Temperature Min: - 20 C; Package / Case: 3; Supplier 1: Mouser; Supplier 1 Part Number: N/A; Supplier 2: Digi-Key; Supplier 2 Part Number: N/A; Supplier 3: thegioiic; Supplier 3 Part Number: N/A
footprint 619000311021 (2.54mm Male Left Angled Header Bottom Locking, 3p)
pins: 1, 2, 3
